# Altium schematic symbol library jlcpcb_2025_04_inductors_extended_0603.schlib: 1269 symbols (part 1 of 7) (continued)
## CMI160808U4R7MT
designator L?  Inductance: 4.7uH
Inductor, 4.7uH, ±20%, SMD 0603; Manufacturer: FH (Guangdong Fenghua Advanced Tech); Manufacturer Part Number: CMI160808U4R7MT; Package Size: 0603; JLCPCB Basic Part: No; JLCPCB Part Number: C3032678; Supplier 1: LCSC; Category: Inductors; Supplier Part Number 1: C3032678; Tolerance: ±20%; RoHS: Yes; ComponentLink1Description: Datasheet; ComponentLink1URL: https://wmsc.lcsc.com/wmsc/upload/file/pdf/v2/lcsc/2208051501_FH--Guangdong-Fenghua-Advanced-Tech-CMI160808U4R7MT_C3032678.pdf; ComponentLink2Description: JLCPCB Part URL; ComponentLink2URL: https://jlcpcb.com/partdetail/C3032678; ComponentLink3Description: LCSC Part URL; ComponentLink3URL: https://lcsc.com/product-detail/Inductors-SMD_FH-Guangdong-Fenghua-Advanced-Tech-FH-Guangdong-Fenghua-Advanced-Tech-CMI160808U4R7MT_C3032678.html
footprint IND-0603 (0603 (1608M) Inductor)
pins: 1, 2

## CMI160808V47NKT
designator L?  Inductance: 47nH
Inductor, 47nH, ±10%, SMD 0603; Manufacturer: FH (Guangdong Fenghua Advanced Tech); Manufacturer Part Number: CMI160808V47NKT; Package Size: 0603; JLCPCB Basic Part: No; JLCPCB Part Number: C3032610; Supplier 1: LCSC; Category: Inductors; Supplier Part Number 1: C3032610; Tolerance: ±10%; RoHS: Yes; ComponentLink1Description: Datasheet; ComponentLink1URL: https://wmsc.lcsc.com/wmsc/upload/file/pdf/v2/lcsc/2302231130_FH--Guangdong-Fenghua-Advanced-Tech-CMI160808V47NKT_C3032610.pdf; ComponentLink2Description: JLCPCB Part URL; ComponentLink2URL: https://jlcpcb.com/partdetail/C3032610; ComponentLink3Description: LCSC Part URL; ComponentLink3URL: https://lcsc.com/product-detail/Inductors-SMD_FH-Guangdong-Fenghua-Advanced-Tech-FH-Guangdong-Fenghua-Advanced-Tech-CMI160808V47NKT_C3032610.html
footprint IND-0603 (0603 (1608M) Inductor)
pins: 1, 2

## CMI160808V68NKT
designator L?  Inductance: 68nH
Inductor, 68nH, ±10%, SMD 0603; Manufacturer: FH (Guangdong Fenghua Advanced Tech); Manufacturer Part Number: CMI160808V68NKT; Package Size: 0603; JLCPCB Basic Part: No; JLCPCB Part Number: C3032609; Supplier 1: LCSC; Category: Inductors; Supplier Part Number 1: C3032609; Tolerance: ±10%; RoHS: Yes; ComponentLink1Description: Datasheet; ComponentLink1URL: https://wmsc.lcsc.com/wmsc/upload/file/pdf/v2/lcsc/2302231130_FH--Guangdong-Fenghua-Advanced-Tech-CMI160808V68NKT_C3032609.pdf; ComponentLink2Description: JLCPCB Part URL; ComponentLink2URL: https://jlcpcb.com/partdetail/C3032609; ComponentLink3Description: LCSC Part URL; ComponentLink3URL: https://lcsc.com/product-detail/Inductors-SMD_FH-Guangdong-Fenghua-Advanced-Tech-FH-Guangdong-Fenghua-Advanced-Tech-CMI160808V68NKT_C3032609.html
footprint IND-0603 (0603 (1608M) Inductor)
pins: 1, 2

## CMI160808V82NKT
designator L?  Inductance: 82nH
Inductor, 82nH, ±10%, SMD 0603; Manufacturer: FH (Guangdong Fenghua Advanced Tech); Manufacturer Part Number: CMI160808V82NKT; Package Size: 0603; JLCPCB Basic Part: No; JLCPCB Part Number: C3032612; Supplier 1: LCSC; Category: Inductors; Supplier Part Number 1: C3032612; Tolerance: ±10%; RoHS: Yes; ComponentLink1Description: Datasheet; ComponentLink1URL: https://wmsc.lcsc.com/wmsc/upload/file/pdf/v2/lcsc/2302231130_FH--Guangdong-Fenghua-Advanced-Tech-CMI160808V82NKT_C3032612.pdf; ComponentLink2Description: JLCPCB Part URL; ComponentLink2URL: https://jlcpcb.com/partdetail/C3032612; ComponentLink3Description: LCSC Part URL; ComponentLink3URL: https://lcsc.com/product-detail/Inductors-SMD_FH-Guangdong-Fenghua-Advanced-Tech-FH-Guangdong-Fenghua-Advanced-Tech-CMI160808V82NKT_C3032612.html
footprint IND-0603 (0603 (1608M) Inductor)
pins: 1, 2

## CMI160808VR10KT
designator L?  Inductance: 100nH
Inductor, 100nH, ±10%, 250mΩ, 50mA, SMD 0603; Manufacturer: FH(Guangdong Fenghua Advanced Tech); Manufacturer Part Number: CMI160808VR10KT; Package Size: 0603; JLCPCB Basic Part: No; JLCPCB Part Number: C394965; Supplier 1: LCSC; Category: Inductors; Supplier Part Number 1: C394965; Tolerance: ±10%; Rated Current: 50mA; DC Resistance: 250mΩ; RoHS: Yes; ComponentLink1Description: Datasheet; ComponentLink1URL: https://wmsc.lcsc.com/wmsc/upload/file/pdf/v2/lcsc/2302231208_FH--Guangdong-Fenghua-Advanced-Tech-CMI160808VR10KT_C394965.pdf; ComponentLink2Description: JLCPCB Part URL; ComponentLink2URL: https://jlcpcb.com/partdetail/C394965; ComponentLink3Description: LCSC Part URL; ComponentLink3URL: https://lcsc.com/product-detail/Inductors-SMD_FH-Guangdong-Fenghua-Advanced-Tech-FH-Guangdong-Fenghua-Advanced-Tech-CMI160808VR10KT_C394965.html
footprint IND-0603 (0603 (1608M) Inductor)
pins: 1, 2

## CMI160808VR12KT
designator L?  Inductance: 120nH
Inductor, 120nH, ±10%, 300mΩ, 50mA, SMD 0603; Manufacturer: FH(Guangdong Fenghua Advanced Tech); Manufacturer Part Number: CMI160808VR12KT; Package Size: 0603; JLCPCB Basic Part: No; JLCPCB Part Number: C394966; Supplier 1: LCSC; Category: Inductors; Supplier Part Number 1: C394966; Tolerance: ±10%; Rated Current: 50mA; DC Resistance: 300mΩ; RoHS: Yes; ComponentLink1Description: Datasheet; ComponentLink1URL: https://wmsc.lcsc.com/wmsc/upload/file/pdf/v2/lcsc/2302231208_FH--Guangdong-Fenghua-Advanced-Tech-CMI160808VR12KT_C394966.pdf; ComponentLink2Description: JLCPCB Part URL; ComponentLink2URL: https://jlcpcb.com/partdetail/C394966; ComponentLink3Description: LCSC Part URL; ComponentLink3URL: https://lcsc.com/product-detail/Inductors-SMD_FH-Guangdong-Fenghua-Advanced-Tech-FH-Guangdong-Fenghua-Advanced-Tech-CMI160808VR12KT_C394966.html
footprint IND-0603 (0603 (1608M) Inductor)
pins: 1, 2

## CMI160808VR15KT
designator L?  Inductance: 150nH
Inductor, 150nH, ±10%, 300mΩ, 50mA, SMD 0603; Manufacturer: FH(Guangdong Fenghua Advanced Tech); Manufacturer Part Number: CMI160808VR15KT; Package Size: 0603; JLCPCB Basic Part: No; JLCPCB Part Number: C394967; Supplier 1: LCSC; Category: Inductors; Supplier Part Number 1: C394967; Tolerance: ±10%; Rated Current: 50mA; DC Resistance: 300mΩ; RoHS: Yes; ComponentLink1Description: Datasheet; ComponentLink1URL: https://wmsc.lcsc.com/wmsc/upload/file/pdf/v2/lcsc/2302231208_FH--Guangdong-Fenghua-Advanced-Tech-CMI160808VR15KT_C394967.pdf; ComponentLink2Description: JLCPCB Part URL; ComponentLink2URL: https://jlcpcb.com/partdetail/C394967; ComponentLink3Description: LCSC Part URL; ComponentLink3URL: https://lcsc.com/product-detail/Inductors-SMD_FH-Guangdong-Fenghua-Advanced-Tech-FH-Guangdong-Fenghua-Advanced-Tech-CMI160808VR15KT_C394967.html
footprint IND-0603 (0603 (1608M) Inductor)
pins: 1, 2

## CMI160808VR18KT
designator L?  Inductance: 180nH
Inductor, 180nH, ±10%, 300mΩ, 50mA, SMD 0603; Manufacturer: FH(Guangdong Fenghua Advanced Tech); Manufacturer Part Number: CMI160808VR18KT; Package Size: 0603; JLCPCB Basic Part: No; JLCPCB Part Number: C361670; Supplier 1: LCSC; Category: Inductors; Supplier Part Number 1: C361670; Tolerance: ±10%; Rated Current: 50mA; DC Resistance: 300mΩ; RoHS: Yes; ComponentLink1Description: Datasheet; ComponentLink1URL: https://wmsc.lcsc.com/wmsc/upload/file/pdf/v2/lcsc/2302231208_FH--Guangdong-Fenghua-Advanced-Tech-CMI160808VR18KT_C361670.pdf; ComponentLink2Description: JLCPCB Part URL; ComponentLink2URL: https://jlcpcb.com/partdetail/C361670; ComponentLink3Description: LCSC Part URL; ComponentLink3URL: https://lcsc.com/product-detail/Inductors-SMD_FH-Guangdong-Fenghua-Advanced-Tech-FH-Guangdong-Fenghua-Advanced-Tech-CMI160808VR18KT_C361670.html
footprint IND-0603 (0603 (1608M) Inductor)
pins: 1, 2

## CMI160808VR22KT
designator L?  Inductance: 220nH
Inductor, 220nH, ±10%, 400mΩ, 50mA, SMD 0603; Manufacturer: FH(Guangdong Fenghua Advanced Tech); Manufacturer Part Number: CMI160808VR22KT; Package Size: 0603; JLCPCB Basic Part: No; JLCPCB Part Number: C139211; Supplier 1: LCSC; Category: Inductors; Supplier Part Number 1: C139211; Tolerance: ±10%; Rated Current: 50mA; DC Resistance: 400mΩ; RoHS: Yes; ComponentLink1Description: Datasheet; ComponentLink1URL: https://wmsc.lcsc.com/wmsc/upload/file/pdf/v2/lcsc/2302231230_FH--Guangdong-Fenghua-Advanced-Tech-CMI160808VR22KT_C139211.pdf; ComponentLink2Description: JLCPCB Part URL; ComponentLink2URL: https://jlcpcb.com/partdetail/C139211; ComponentLink3Description: LCSC Part URL; ComponentLink3URL: https://lcsc.com/product-detail/Inductors-SMD_FH-Guangdong-Fenghua-Advanced-Tech-FH-Guangdong-Fenghua-Advanced-Tech-CMI160808VR22KT_C139211.html
footprint IND-0603 (0603 (1608M) Inductor)
pins: 1, 2

## CMI160808VR27KT
designator L?  Inductance: 270nH
Inductor, 270nH, ±10%, 450mΩ, 50mA, SMD 0603; Manufacturer: FH(Guangdong Fenghua Advanced Tech); Manufacturer Part Number: CMI160808VR27KT; Package Size: 0603; JLCPCB Basic Part: No; JLCPCB Part Number: C139212; Supplier 1: LCSC; Category: Inductors; Supplier Part Number 1: C139212; Tolerance: ±10%; Rated Current: 50mA; DC Resistance: 450mΩ; RoHS: Yes; ComponentLink1Description: Datasheet; ComponentLink1URL: https://wmsc.lcsc.com/wmsc/upload/file/pdf/v2/lcsc/2302231230_FH--Guangdong-Fenghua-Advanced-Tech-CMI160808VR27KT_C139212.pdf; ComponentLink2Description: JLCPCB Part URL; ComponentLink2URL: https://jlcpcb.com/partdetail/C139212; ComponentLink3Description: LCSC Part URL; ComponentLink3URL: https://lcsc.com/product-detail/Inductors-SMD_FH-Guangdong-Fenghua-Advanced-Tech-FH-Guangdong-Fenghua-Advanced-Tech-CMI160808VR27KT_C139212.html
footprint IND-0603 (0603 (1608M) Inductor)
pins: 1, 2

## CMI160808VR33KT
designator L?  Inductance: 330nH
Inductor, 330nH, ±10%, 500mΩ, 50mA, SMD 0603; Manufacturer: FH(Guangdong Fenghua Advanced Tech); Manufacturer Part Number: CMI160808VR33KT; Package Size: 0603; JLCPCB Basic Part: No; JLCPCB Part Number: C394968; Supplier 1: LCSC; Category: Inductors; Supplier Part Number 1: C394968; Tolerance: ±10%; Rated Current: 50mA; DC Resistance: 500mΩ; RoHS: Yes; ComponentLink1Description: Datasheet; ComponentLink1URL: https://wmsc.lcsc.com/wmsc/upload/file/pdf/v2/lcsc/2302231208_FH--Guangdong-Fenghua-Advanced-Tech-CMI160808VR33KT_C394968.pdf; ComponentLink2Description: JLCPCB Part URL; ComponentLink2URL: https://jlcpcb.com/partdetail/C394968; ComponentLink3Description: LCSC Part URL; ComponentLink3URL: https://lcsc.com/product-detail/Inductors-SMD_FH-Guangdong-Fenghua-Advanced-Tech-FH-Guangdong-Fenghua-Advanced-Tech-CMI160808VR33KT_C394968.html
footprint IND-0603 (0603 (1608M) Inductor)
pins: 1, 2

## CMI160808VR39KT
designator L?  Inductance: 390nH
Inductor, 390nH, ±10%, 600mΩ, 50mA, SMD 0603; Manufacturer: FH(Guangdong Fenghua Advanced Tech); Manufacturer Part Number: CMI160808VR39KT; Package Size: 0603; JLCPCB Basic Part: No; JLCPCB Part Number: C139213; Supplier 1: LCSC; Category: Inductors; Supplier Part Number 1: C139213; Tolerance: ±10%; Rated Current: 50mA; DC Resistance: 600mΩ; RoHS: Yes; ComponentLink1Description: Datasheet; ComponentLink1URL: https://wmsc.lcsc.com/wmsc/upload/file/pdf/v2/lcsc/2302231230_FH--Guangdong-Fenghua-Advanced-Tech-CMI160808VR39KT_C139213.pdf; ComponentLink2Description: JLCPCB Part URL; ComponentLink2URL: https://jlcpcb.com/partdetail/C139213; ComponentLink3Description: LCSC Part URL; ComponentLink3URL: https://lcsc.com/product-detail/Inductors-SMD_FH-Guangdong-Fenghua-Advanced-Tech-FH-Guangdong-Fenghua-Advanced-Tech-CMI160808VR39KT_C139213.html
footprint IND-0603 (0603 (1608M) Inductor)
pins: 1, 2

## CMI160808VR47KT
designator L?  Inductance: 470nH
Inductor, 470nH, ±10%, 700mΩ, 50mA, SMD 0603; Manufacturer: FH(Guangdong Fenghua Advanced Tech); Manufacturer Part Number: CMI160808VR47KT; Package Size: 0603; JLCPCB Basic Part: No; JLCPCB Part Number: C139214; Supplier 1: LCSC; Category: Inductors; Supplier Part Number 1: C139214; Tolerance: ±10%; Rated Current: 50mA; DC Resistance: 700mΩ; RoHS: Yes; ComponentLink1Description: Datasheet; ComponentLink1URL: https://wmsc.lcsc.com/wmsc/upload/file/pdf/v2/lcsc/2302231230_FH--Guangdong-Fenghua-Advanced-Tech-CMI160808VR47KT_C139214.pdf; ComponentLink2Description: JLCPCB Part URL; ComponentLink2URL: https://jlcpcb.com/partdetail/C139214; ComponentLink3Description: LCSC Part URL; ComponentLink3URL: https://lcsc.com/product-detail/Inductors-SMD_FH-Guangdong-Fenghua-Advanced-Tech-FH-Guangdong-Fenghua-Advanced-Tech-CMI160808VR47KT_C139214.html
footprint IND-0603 (0603 (1608M) Inductor)
pins: 1, 2

## CMI160808VR56KT
designator L?  Inductance: 560nH
Inductor, 560nH, ±10%, 700mΩ, 50mA, SMD 0603; Manufacturer: FH(Guangdong Fenghua Advanced Tech); Manufacturer Part Number: CMI160808VR56KT; Package Size: 0603; JLCPCB Basic Part: No; JLCPCB Part Number: C139215; Supplier 1: LCSC; Category: Inductors; Supplier Part Number 1: C139215; Tolerance: ±10%; Rated Current: 50mA; DC Resistance: 700mΩ; RoHS: Yes; ComponentLink1Description: Datasheet; ComponentLink1URL: https://wmsc.lcsc.com/wmsc/upload/file/pdf/v2/lcsc/2302231230_FH--Guangdong-Fenghua-Advanced-Tech-CMI160808VR56KT_C139215.pdf; ComponentLink2Description: JLCPCB Part URL; ComponentLink2URL: https://jlcpcb.com/partdetail/C139215; ComponentLink3Description: LCSC Part URL; ComponentLink3URL: https://lcsc.com/product-detail/Inductors-SMD_FH-Guangdong-Fenghua-Advanced-Tech-FH-Guangdong-Fenghua-Advanced-Tech-CMI160808VR56KT_C139215.html
footprint IND-0603 (0603 (1608M) Inductor)
pins: 1, 2

## CMI160808VR68KT
designator L?  Inductance: 680nH
Inductor, 680nH, ±10%, 900mΩ, 50mA, SMD 0603; Manufacturer: FH(Guangdong Fenghua Advanced Tech); Manufacturer Part Number: CMI160808VR68KT; Package Size: 0603; JLCPCB Basic Part: No; JLCPCB Part Number: C139216; Supplier 1: LCSC; Category: Inductors; Supplier Part Number 1: C139216; Tolerance: ±10%; Rated Current: 50mA; DC Resistance: 900mΩ; RoHS: Yes; ComponentLink1Description: Datasheet; ComponentLink1URL: https://wmsc.lcsc.com/wmsc/upload/file/pdf/v2/lcsc/2302231230_FH--Guangdong-Fenghua-Advanced-Tech-CMI160808VR68KT_C139216.pdf; ComponentLink2Description: JLCPCB Part URL; ComponentLink2URL: https://jlcpcb.com/partdetail/C139216; ComponentLink3Description: LCSC Part URL; ComponentLink3URL: https://lcsc.com/product-detail/Inductors-SMD_FH-Guangdong-Fenghua-Advanced-Tech-FH-Guangdong-Fenghua-Advanced-Tech-CMI160808VR68KT_C139216.html
footprint IND-0603 (0603 (1608M) Inductor)
pins: 1, 2

## CMI160808VR82KT
designator L?  Inductance: 820nH
Inductor, 820nH, ±10%, 1Ω, 50mA, SMD 0603; Manufacturer: FH(Guangdong Fenghua Advanced Tech); Manufacturer Part Number: CMI160808VR82KT; Package Size: 0603; JLCPCB Basic Part: No; JLCPCB Part Number: C139217; Supplier 1: LCSC; Category: Inductors; Supplier Part Number 1: C139217; Tolerance: ±10%; Rated Current: 50mA; DC Resistance: 1Ω; RoHS: Yes; ComponentLink1Description: Datasheet; ComponentLink1URL: https://wmsc.lcsc.com/wmsc/upload/file/pdf/v2/lcsc/2302231230_FH--Guangdong-Fenghua-Advanced-Tech-CMI160808VR82KT_C139217.pdf; ComponentLink2Description: JLCPCB Part URL; ComponentLink2URL: https://jlcpcb.com/partdetail/C139217; ComponentLink3Description: LCSC Part URL; ComponentLink3URL: https://lcsc.com/product-detail/Inductors-SMD_FH-Guangdong-Fenghua-Advanced-Tech-FH-Guangdong-Fenghua-Advanced-Tech-CMI160808VR82KT_C139217.html
footprint IND-0603 (0603 (1608M) Inductor)
pins: 1, 2

## CMP160808JE5R6MT
designator L?  Inductance: 5.6uH
Inductor, 5.6uH, ±20%, 900mΩ, 60mA, SMD 0603; Manufacturer: FH(Guangdong Fenghua Advanced Tech); Manufacturer Part Number: CMP160808JE5R6MT; Self-Resonant Frequency: 22MHz; Package Size: 0603; JLCPCB Basic Part: No; JLCPCB Part Number: C395002; Supplier 1: LCSC; Category: Inductors; Supplier Part Number 1: C395002; Tolerance: ±20%; Rated Current: 60mA; DC Resistance: 900mΩ; RoHS: Yes; ComponentLink1Description: Datasheet; ComponentLink1URL: https://wmsc.lcsc.com/wmsc/upload/file/pdf/v2/lcsc/2302231030_FH--Guangdong-Fenghua-Advanced-Tech-CMP160808JE5R6MT_C395002.pdf; ComponentLink2Description: JLCPCB Part URL; ComponentLink2URL: https://jlcpcb.com/partdetail/C395002; ComponentLink3Description: LCSC Part URL; ComponentLink3URL: https://lcsc.com/product-detail/Inductors-SMD_FH-Guangdong-Fenghua-Advanced-Tech-FH-Guangdong-Fenghua-Advanced-Tech-CMP160808JE5R6MT_C395002.html
footprint IND-0603 (0603 (1608M) Inductor)
pins: 1, 2

## CMP160808JE6R8MT
designator L?  Inductance: 6.8uH
Inductor, 6.8uH, ±20%, 900mΩ, 60mA, SMD 0603; Manufacturer: FH(Guangdong Fenghua Advanced Tech); Manufacturer Part Number: CMP160808JE6R8MT; Self-Resonant Frequency: 20MHz; Package Size: 0603; JLCPCB Basic Part: No; JLCPCB Part Number: C395003; Supplier 1: LCSC; Category: Inductors; Supplier Part Number 1: C395003; Tolerance: ±20%; Rated Current: 60mA; DC Resistance: 900mΩ; RoHS: Yes; ComponentLink1Description: Datasheet; ComponentLink1URL: https://wmsc.lcsc.com/wmsc/upload/file/pdf/v2/lcsc/2302231030_FH--Guangdong-Fenghua-Advanced-Tech-CMP160808JE6R8MT_C395003.pdf; ComponentLink2Description: JLCPCB Part URL; ComponentLink2URL: https://jlcpcb.com/partdetail/C395003; ComponentLink3Description: LCSC Part URL; ComponentLink3URL: https://lcsc.com/product-detail/Inductors-SMD_FH-Guangdong-Fenghua-Advanced-Tech-FH-Guangdong-Fenghua-Advanced-Tech-CMP160808JE6R8MT_C395003.html
footprint IND-0603 (0603 (1608M) Inductor)
pins: 1, 2

## CMP160808JE8R2MT
designator L?  Inductance: 8.2uH
Inductor, 8.2uH, ±20%, 1.05Ω, 60mA, SMD 0603; Manufacturer: FH(Guangdong Fenghua Advanced Tech); Manufacturer Part Number: CMP160808JE8R2MT; Self-Resonant Frequency: 18MHz; Package Size: 0603; JLCPCB Basic Part: No; JLCPCB Part Number: C395004; Supplier 1: LCSC; Category: Inductors; Supplier Part Number 1: C395004; Tolerance: ±20%; Rated Current: 60mA; DC Resistance: 1.05Ω; RoHS: Yes; ComponentLink1Description: Datasheet; ComponentLink1URL: https://wmsc.lcsc.com/wmsc/upload/file/pdf/v2/lcsc/2302231030_FH--Guangdong-Fenghua-Advanced-Tech-CMP160808JE8R2MT_C395004.pdf; ComponentLink2Description: JLCPCB Part URL; ComponentLink2URL: https://jlcpcb.com/partdetail/C395004; ComponentLink3Description: LCSC Part URL; ComponentLink3URL: https://lcsc.com/product-detail/Inductors-SMD_FH-Guangdong-Fenghua-Advanced-Tech-FH-Guangdong-Fenghua-Advanced-Tech-CMP160808JE8R2MT_C395004.html
footprint IND-0603 (0603 (1608M) Inductor)
pins: 1, 2

## CMP160808JE100MT
designator L?  Inductance: 10uH
Inductor, 10uH, ±20%, 1.15Ω, 60mA, SMD 0603; Manufacturer: FH(Guangdong Fenghua Advanced Tech); Manufacturer Part Number: CMP160808JE100MT; Self-Resonant Frequency: 17MHz; Package Size: 0603; JLCPCB Basic Part: No; JLCPCB Part Number: C395000; Supplier 1: LCSC; Category: Inductors; Supplier Part Number 1: C395000; Tolerance: ±20%; Rated Current: 60mA; DC Resistance: 1.15Ω; RoHS: Yes; ComponentLink1Description: Datasheet; ComponentLink1URL: https://wmsc.lcsc.com/wmsc/upload/file/pdf/v2/lcsc/2302231030_FH--Guangdong-Fenghua-Advanced-Tech-CMP160808JE100MT_C395000.pdf; ComponentLink2Description: JLCPCB Part URL; ComponentLink2URL: https://jlcpcb.com/partdetail/C395000; ComponentLink3Description: LCSC Part URL; ComponentLink3URL: https://lcsc.com/product-detail/Inductors-SMD_FH-Guangdong-Fenghua-Advanced-Tech-FH-Guangdong-Fenghua-Advanced-Tech-CMP160808JE100MT_C395000.html
footprint IND-0603 (0603 (1608M) Inductor)
pins: 1, 2

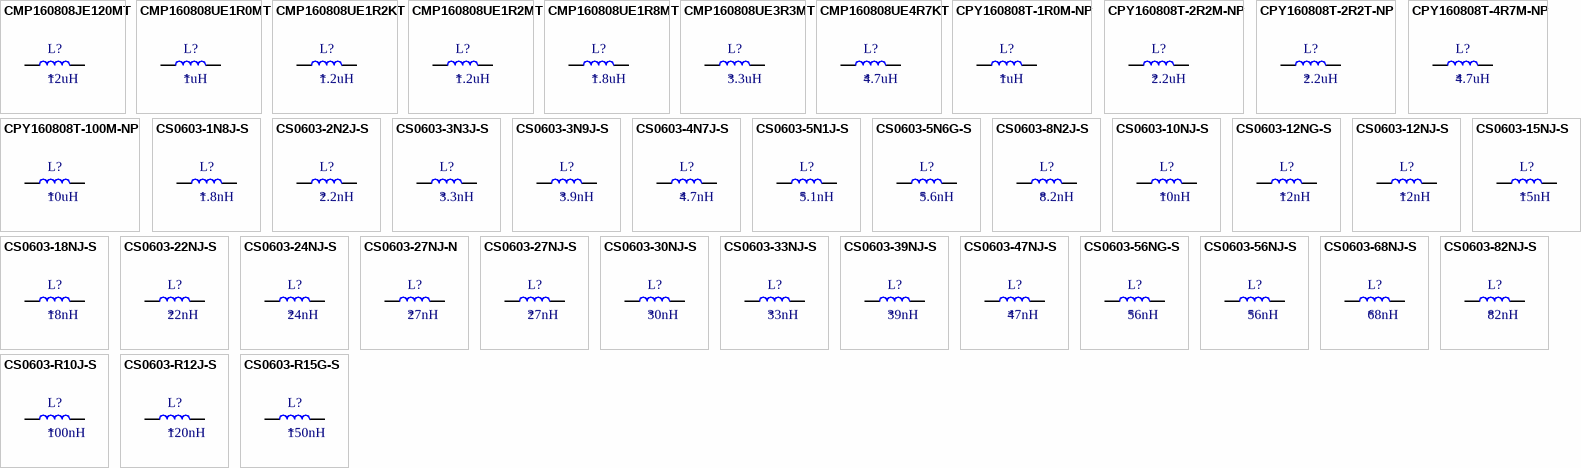
[diagram p4: symbols CMP160808JE120MT to CS0603-R15G-S]

## CMP160808JE120MT
designator L?  Inductance: 12uH
Inductor, 12uH, ±20%, 1.25Ω, 60mA, SMD 0603; Manufacturer: FH(Guangdong Fenghua Advanced Tech); Manufacturer Part Number: CMP160808JE120MT; Self-Resonant Frequency: 15MHz; Package Size: 0603; JLCPCB Basic Part: No; JLCPCB Part Number: C395001; Supplier 1: LCSC; Category: Inductors; Supplier Part Number 1: C395001; Tolerance: ±20%; Rated Current: 60mA; DC Resistance: 1.25Ω; RoHS: Yes; ComponentLink1Description: Datasheet; ComponentLink1URL: https://wmsc.lcsc.com/wmsc/upload/file/pdf/v2/lcsc/2302231030_FH--Guangdong-Fenghua-Advanced-Tech-CMP160808JE120MT_C395001.pdf; ComponentLink2Description: JLCPCB Part URL; ComponentLink2URL: https://jlcpcb.com/partdetail/C395001; ComponentLink3Description: LCSC Part URL; ComponentLink3URL: https://lcsc.com/product-detail/Inductors-SMD_FH-Guangdong-Fenghua-Advanced-Tech-FH-Guangdong-Fenghua-Advanced-Tech-CMP160808JE120MT_C395001.html
footprint IND-0603 (0603 (1608M) Inductor)
pins: 1, 2

## CMP160808UE1R0MT
designator L?  Inductance: 1uH
Inductor, 1uH, ±20%, 300mΩ, 150mA, SMD 0603; Manufacturer: FH(Guangdong Fenghua Advanced Tech); Manufacturer Part Number: CMP160808UE1R0MT; Self-Resonant Frequency: 75MHz; Package Size: 0603; JLCPCB Basic Part: No; JLCPCB Part Number: C395005; Supplier 1: LCSC; Category: Inductors; Supplier Part Number 1: C395005; Tolerance: ±20%; Rated Current: 150mA; DC Resistance: 300mΩ; RoHS: Yes; ComponentLink1Description: Datasheet; ComponentLink1URL: https://wmsc.lcsc.com/wmsc/upload/file/pdf/v2/lcsc/2302231030_FH--Guangdong-Fenghua-Advanced-Tech-CMP160808UE1R0MT_C395005.pdf; ComponentLink2Description: JLCPCB Part URL; ComponentLink2URL: https://jlcpcb.com/partdetail/C395005; ComponentLink3Description: LCSC Part URL; ComponentLink3URL: https://lcsc.com/product-detail/Inductors-SMD_FH-Guangdong-Fenghua-Advanced-Tech-FH-Guangdong-Fenghua-Advanced-Tech-CMP160808UE1R0MT_C395005.html
footprint IND-0603 (0603 (1608M) Inductor)
pins: 1, 2

## CMP160808UE1R2KT
designator L?  Inductance: 1.2uH
Inductor, 1.2uH, ±10%, SMD 0603; Manufacturer: FH(Guangdong Fenghua Advanced Tech); Manufacturer Part Number: CMP160808UE1R2KT; Package Size: 0603; JLCPCB Basic Part: No; JLCPCB Part Number: C401478; Supplier 1: LCSC; Category: Inductors; Supplier Part Number 1: C401478; Tolerance: ±10%; RoHS: Yes; ComponentLink1Description: Datasheet; ComponentLink1URL: https://wmsc.lcsc.com/wmsc/upload/file/pdf/v2/lcsc/1912111437_FH--Guangdong-Fenghua-Advanced-Tech-CMP160808UE1R2KT_C401478.pdf; ComponentLink2Description: JLCPCB Part URL; ComponentLink2URL: https://jlcpcb.com/partdetail/C401478; ComponentLink3Description: LCSC Part URL; ComponentLink3URL: https://lcsc.com/product-detail/Inductors-SMD_FH-Guangdong-Fenghua-Advanced-Tech-FH-Guangdong-Fenghua-Advanced-Tech-CMP160808UE1R2KT_C401478.html
footprint IND-0603 (0603 (1608M) Inductor)
pins: 1, 2

## CMP160808UE1R2MT
designator L?  Inductance: 1.2uH
Inductor, 1.2uH, ±20%, 300mΩ, 150mA, SMD 0603; Manufacturer: FH(Guangdong Fenghua Advanced Tech); Manufacturer Part Number: CMP160808UE1R2MT; Self-Resonant Frequency: 65MHz; Package Size: 0603; JLCPCB Basic Part: No; JLCPCB Part Number: C395006; Supplier 1: LCSC; Category: Inductors; Supplier Part Number 1: C395006; Tolerance: ±20%; Rated Current: 150mA; DC Resistance: 300mΩ; RoHS: Yes; ComponentLink1Description: Datasheet; ComponentLink1URL: https://wmsc.lcsc.com/wmsc/upload/file/pdf/v2/lcsc/2302231030_FH--Guangdong-Fenghua-Advanced-Tech-CMP160808UE1R2MT_C395006.pdf; ComponentLink2Description: JLCPCB Part URL; ComponentLink2URL: https://jlcpcb.com/partdetail/C395006; ComponentLink3Description: LCSC Part URL; ComponentLink3URL: https://lcsc.com/product-detail/Inductors-SMD_FH-Guangdong-Fenghua-Advanced-Tech-FH-Guangdong-Fenghua-Advanced-Tech-CMP160808UE1R2MT_C395006.html
footprint IND-0603 (0603 (1608M) Inductor)
pins: 1, 2

## CMP160808UE1R8MT
designator L?  Inductance: 1.8uH
Inductor, 1.8uH, ±20%, 400mΩ, 120mA, SMD 0603; Manufacturer: FH(Guangdong Fenghua Advanced Tech); Manufacturer Part Number: CMP160808UE1R8MT; Self-Resonant Frequency: 55MHz; Package Size: 0603; JLCPCB Basic Part: No; JLCPCB Part Number: C395007; Supplier 1: LCSC; Category: Inductors; Supplier Part Number 1: C395007; Tolerance: ±20%; Rated Current: 120mA; DC Resistance: 400mΩ; RoHS: Yes; ComponentLink1Description: Datasheet; ComponentLink1URL: https://wmsc.lcsc.com/wmsc/upload/file/pdf/v2/lcsc/2302231030_FH--Guangdong-Fenghua-Advanced-Tech-CMP160808UE1R8MT_C395007.pdf; ComponentLink2Description: JLCPCB Part URL; ComponentLink2URL: https://jlcpcb.com/partdetail/C395007; ComponentLink3Description: LCSC Part URL; ComponentLink3URL: https://lcsc.com/product-detail/Inductors-SMD_FH-Guangdong-Fenghua-Advanced-Tech-FH-Guangdong-Fenghua-Advanced-Tech-CMP160808UE1R8MT_C395007.html
footprint IND-0603 (0603 (1608M) Inductor)
pins: 1, 2

## CMP160808UE3R3MT
designator L?  Inductance: 3.3uH
Inductor, 3.3uH, ±20%, SMD 0603; Manufacturer: FH(Guangdong Fenghua Advanced Tech); Manufacturer Part Number: CMP160808UE3R3MT; Package Size: 0603; JLCPCB Basic Part: No; JLCPCB Part Number: C395008; Supplier 1: LCSC; Category: Inductors; Supplier Part Number 1: C395008; Tolerance: ±20%; RoHS: Yes; ComponentLink1Description: Datasheet; ComponentLink1URL: https://wmsc.lcsc.com/wmsc/upload/file/pdf/v2/lcsc/2302231030_FH--Guangdong-Fenghua-Advanced-Tech-CMP160808UE3R3MT_C395008.pdf; ComponentLink2Description: JLCPCB Part URL; ComponentLink2URL: https://jlcpcb.com/partdetail/C395008; ComponentLink3Description: LCSC Part URL; ComponentLink3URL: https://lcsc.com/product-detail/Inductors-SMD_FH-Guangdong-Fenghua-Advanced-Tech-FH-Guangdong-Fenghua-Advanced-Tech-CMP160808UE3R3MT_C395008.html
footprint IND-0603 (0603 (1608M) Inductor)
pins: 1, 2

## CMP160808UE4R7KT
designator L?  Inductance: 4.7uH
Inductor, 4.7uH, ±10%, SMD 0603; Manufacturer: FH (Guangdong Fenghua Advanced Tech); Manufacturer Part Number: CMP160808UE4R7KT; Package Size: 0603; JLCPCB Basic Part: No; JLCPCB Part Number: C778447; Supplier 1: LCSC; Category: Inductors; Supplier Part Number 1: C778447; Tolerance: ±10%; RoHS: Yes; ComponentLink1Description: Datasheet; ComponentLink2Description: JLCPCB Part URL; ComponentLink2URL: https://jlcpcb.com/partdetail/C778447; ComponentLink3Description: LCSC Part URL; ComponentLink3URL: https://lcsc.com/product-detail/Inductors-SMD_FH-Guangdong-Fenghua-Advanced-Tech-FH-Guangdong-Fenghua-Advanced-Tech-CMP160808UE4R7KT_C778447.html
footprint IND-0603 (0603 (1608M) Inductor)
pins: 1, 2

## CPY160808T-1R0M-NP
designator L?  Inductance: 1uH
Inductor, 1uH, ±20%, 120mΩ, 1.5A, SMD 0603; Manufacturer: Chilisin Elec; Manufacturer Part Number: CPY160808T-1R0M-NP; Package Size: 0603; JLCPCB Basic Part: No; JLCPCB Part Number: C285967; Supplier 1: LCSC; Category: Inductors; Supplier Part Number 1: C285967; Tolerance: ±20%; Rated Current: 1.5A; DC Resistance: 120mΩ; RoHS: Yes; ComponentLink1Description: Datasheet; ComponentLink1URL: https://wmsc.lcsc.com/wmsc/upload/file/pdf/v2/lcsc/2108251130_Chilisin-Elec-CPY160808T-1R0M-NP_C285967.pdf; ComponentLink2Description: JLCPCB Part URL; ComponentLink2URL: https://jlcpcb.com/partdetail/C285967; ComponentLink3Description: LCSC Part URL; ComponentLink3URL: https://lcsc.com/product-detail/Inductors-SMD_Chilisin-Elec-Chilisin-Elec-CPY160808T-1R0M-NP_C285967.html
footprint IND-0603 (0603 (1608M) Inductor)
pins: 1, 2

## CPY160808T-2R2M-NP
designator L?  Inductance: 2.2uH
Inductor, 2.2uH, ±20%, 200mΩ, 1A, SMD 0603; Manufacturer: Chilisin Elec; Manufacturer Part Number: CPY160808T-2R2M-NP; Package Size: 0603; JLCPCB Basic Part: No; JLCPCB Part Number: C365953; Supplier 1: LCSC; Category: Inductors; Supplier Part Number 1: C365953; Tolerance: ±20%; Rated Current: 1A; DC Resistance: 200mΩ; RoHS: Yes; ComponentLink1Description: Datasheet; ComponentLink1URL: https://wmsc.lcsc.com/wmsc/upload/file/pdf/v2/lcsc/1912111437_Chilisin-Elec-CPY160808T-2R2M-NP_C365953.pdf; ComponentLink2Description: JLCPCB Part URL; ComponentLink2URL: https://jlcpcb.com/partdetail/C365953; ComponentLink3Description: LCSC Part URL; ComponentLink3URL: https://lcsc.com/product-detail/Inductors-SMD_Chilisin-Elec-Chilisin-Elec-CPY160808T-2R2M-NP_C365953.html
footprint IND-0603 (0603 (1608M) Inductor)
pins: 1, 2

## CPY160808T-2R2T-NP
designator L?  Inductance: 2.2uH
Inductor, 2.2uH, ±30%, 200mΩ, 1A, SMD 0603; Manufacturer: Chilisin Elec; Manufacturer Part Number: CPY160808T-2R2T-NP; Package Size: 0603; JLCPCB Basic Part: No; JLCPCB Part Number: C285966; Supplier 1: LCSC; Category: Inductors; Supplier Part Number 1: C285966; Tolerance: ±30%; Rated Current: 1A; DC Resistance: 200mΩ; RoHS: Yes; ComponentLink1Description: Datasheet; ComponentLink1URL: https://wmsc.lcsc.com/wmsc/upload/file/pdf/v2/lcsc/2304140030_Chilisin-Elec-CPY160808T-2R2T-NP_C285966.pdf; ComponentLink2Description: JLCPCB Part URL; ComponentLink2URL: https://jlcpcb.com/partdetail/C285966; ComponentLink3Description: LCSC Part URL; ComponentLink3URL: https://lcsc.com/product-detail/Inductors-SMD_Chilisin-Elec-Chilisin-Elec-CPY160808T-2R2T-NP_C285966.html
footprint IND-0603 (0603 (1608M) Inductor)
pins: 1, 2

## CPY160808T-4R7M-NP
designator L?  Inductance: 4.7uH
Inductor, 4.7uH, ±20%, 250mΩ, 800mA, SMD 0603; Manufacturer: Chilisin Elec; Manufacturer Part Number: CPY160808T-4R7M-NP; Package Size: 0603; JLCPCB Basic Part: No; JLCPCB Part Number: C295681; Supplier 1: LCSC; Category: Inductors; Supplier Part Number 1: C295681; Tolerance: ±20%; Rated Current: 800mA; DC Resistance: 250mΩ; RoHS: Yes; ComponentLink1Description: Datasheet; ComponentLink1URL: https://wmsc.lcsc.com/wmsc/upload/file/pdf/v2/lcsc/2304140030_Chilisin-Elec-CPY160808T-4R7M-NP_C295681.pdf; ComponentLink2Description: JLCPCB Part URL; ComponentLink2URL: https://jlcpcb.com/partdetail/C295681; ComponentLink3Description: LCSC Part URL; ComponentLink3URL: https://lcsc.com/product-detail/Inductors-SMD_Chilisin-Elec-Chilisin-Elec-CPY160808T-4R7M-NP_C295681.html
footprint IND-0603 (0603 (1608M) Inductor)
pins: 1, 2

## CPY160808T-100M-NP
designator L?  Inductance: 10uH
Inductor, 10uH, ±20%, 900mΩ, 90mA, SMD 0603; Manufacturer: Chilisin Elec; Manufacturer Part Number: CPY160808T-100M-NP; Package Size: 0603; JLCPCB Basic Part: No; JLCPCB Part Number: C285968; Supplier 1: LCSC; Category: Inductors; Supplier Part Number 1: C285968; Tolerance: ±20%; Rated Current: 90mA; DC Resistance: 900mΩ; RoHS: Yes; ComponentLink1Description: Datasheet; ComponentLink1URL: https://wmsc.lcsc.com/wmsc/upload/file/pdf/v2/lcsc/2304140030_Chilisin-Elec-CPY160808T-100M-NP_C285968.pdf; ComponentLink2Description: JLCPCB Part URL; ComponentLink2URL: https://jlcpcb.com/partdetail/C285968; ComponentLink3Description: LCSC Part URL; ComponentLink3URL: https://lcsc.com/product-detail/Inductors-SMD_Chilisin-Elec-Chilisin-Elec-CPY160808T-100M-NP_C285968.html
footprint IND-0603 (0603 (1608M) Inductor)
pins: 1, 2

## CS0603-1N8J-S
designator L?  Inductance: 1.8nH
Inductor, 1.8nH, ±5%, 45mΩ, 700mA, SMD 0603; Manufacturer: Chilisin Elec; Manufacturer Part Number: CS0603-1N8J-S; Self-Resonant Frequency: 12.5GHz; Q Factor: 16@250MHz; Package Size: 0603; JLCPCB Basic Part: No; JLCPCB Part Number: C280264; Supplier 1: LCSC; Category: Inductors; Supplier Part Number 1: C280264; Tolerance: ±5%; Rated Current: 700mA; DC Resistance: 45mΩ; RoHS: Yes; ComponentLink1Description: Datasheet; ComponentLink1URL: https://wmsc.lcsc.com/wmsc/upload/file/pdf/v2/lcsc/2304140030_Chilisin-Elec-CS0603-1N8J-S_C280264.pdf; ComponentLink2Description: JLCPCB Part URL; ComponentLink2URL: https://jlcpcb.com/partdetail/C280264; ComponentLink3Description: LCSC Part URL; ComponentLink3URL: https://lcsc.com/product-detail/Inductors-SMD_Chilisin-Elec-Chilisin-Elec-CS0603-1N8J-S_C280264.html
footprint IND-0603 (0603 (1608M) Inductor)
pins: 1, 2

## CS0603-2N2J-S
designator L?  Inductance: 2.2nH
Inductor, 2.2nH, ±5%, 250mΩ, 700mA, SMD 0603; Manufacturer: Chilisin Elec; Manufacturer Part Number: CS0603-2N2J-S; Self-Resonant Frequency: 12.5GHz; Q Factor: 13@250MHz; Package Size: 0603; JLCPCB Basic Part: No; JLCPCB Part Number: C280268; Supplier 1: LCSC; Category: Inductors; Supplier Part Number 1: C280268; Tolerance: ±5%; Rated Current: 700mA; DC Resistance: 250mΩ; RoHS: Yes; ComponentLink1Description: Datasheet; ComponentLink1URL: https://wmsc.lcsc.com/wmsc/upload/file/pdf/v2/lcsc/2304140030_Chilisin-Elec-CS0603-2N2J-S_C280268.pdf; ComponentLink2Description: JLCPCB Part URL; ComponentLink2URL: https://jlcpcb.com/partdetail/C280268; ComponentLink3Description: LCSC Part URL; ComponentLink3URL: https://lcsc.com/product-detail/Inductors-SMD_Chilisin-Elec-Chilisin-Elec-CS0603-2N2J-S_C280268.html
footprint IND-0603 (0603 (1608M) Inductor)
pins: 1, 2

## CS0603-3N3J-S
designator L?  Inductance: 3.3nH
Inductor, 3.3nH, ±5%, 45mΩ, 700mA, SMD 0603; Manufacturer: Chilisin Elec; Manufacturer Part Number: CS0603-3N3J-S; Self-Resonant Frequency: 5.9GHz; Q Factor: 35@250MHz; Package Size: 0603; JLCPCB Basic Part: No; JLCPCB Part Number: C280271; Supplier 1: LCSC; Category: Inductors; Supplier Part Number 1: C280271; Tolerance: ±5%; Rated Current: 700mA; DC Resistance: 45mΩ; RoHS: Yes; ComponentLink1Description: Datasheet; ComponentLink1URL: https://wmsc.lcsc.com/wmsc/upload/file/pdf/v2/lcsc/2304140030_Chilisin-Elec-CS0603-3N3J-S_C280271.pdf; ComponentLink2Description: JLCPCB Part URL; ComponentLink2URL: https://jlcpcb.com/partdetail/C280271; ComponentLink3Description: LCSC Part URL; ComponentLink3URL: https://lcsc.com/product-detail/Inductors-SMD_Chilisin-Elec-Chilisin-Elec-CS0603-3N3J-S_C280271.html
footprint IND-0603 (0603 (1608M) Inductor)
pins: 1, 2

## CS0603-3N9J-S
designator L?  Inductance: 3.9nH
Inductor, 3.9nH, ±5%, 80mΩ, 700mA, SMD 0603; Manufacturer: Chilisin Elec; Manufacturer Part Number: CS0603-3N9J-S; Self-Resonant Frequency: 6.9GHz; Q Factor: 22@250MHz; Package Size: 0603; JLCPCB Basic Part: No; JLCPCB Part Number: C280272; Supplier 1: LCSC; Category: Inductors; Supplier Part Number 1: C280272; Tolerance: ±5%; Rated Current: 700mA; DC Resistance: 80mΩ; RoHS: Yes; ComponentLink1Description: Datasheet; ComponentLink1URL: https://wmsc.lcsc.com/wmsc/upload/file/pdf/v2/lcsc/2304140030_Chilisin-Elec-CS0603-3N9J-S_C280272.pdf; ComponentLink2Description: JLCPCB Part URL; ComponentLink2URL: https://jlcpcb.com/partdetail/C280272; ComponentLink3Description: LCSC Part URL; ComponentLink3URL: https://lcsc.com/product-detail/Inductors-SMD_Chilisin-Elec-Chilisin-Elec-CS0603-3N9J-S_C280272.html
footprint IND-0603 (0603 (1608M) Inductor)
pins: 1, 2

## CS0603-4N7J-S
designator L?  Inductance: 4.7nH
Inductor, 4.7nH, ±5%, 116mΩ, 700mA, SMD 0603; Manufacturer: Chilisin Elec; Manufacturer Part Number: CS0603-4N7J-S; Self-Resonant Frequency: 5.8GHz; Q Factor: 20@250MHz; Package Size: 0603; JLCPCB Basic Part: No; JLCPCB Part Number: C280274; Supplier 1: LCSC; Category: Inductors; Supplier Part Number 1: C280274; Tolerance: ±5%; Rated Current: 700mA; DC Resistance: 116mΩ; RoHS: Yes; ComponentLink1Description: Datasheet; ComponentLink1URL: https://wmsc.lcsc.com/wmsc/upload/file/pdf/v2/lcsc/2304140030_Chilisin-Elec-CS0603-4N7J-S_C280274.pdf; ComponentLink2Description: JLCPCB Part URL; ComponentLink2URL: https://jlcpcb.com/partdetail/C280274; ComponentLink3Description: LCSC Part URL; ComponentLink3URL: https://lcsc.com/product-detail/Inductors-SMD_Chilisin-Elec-Chilisin-Elec-CS0603-4N7J-S_C280274.html
footprint IND-0603 (0603 (1608M) Inductor)
pins: 1, 2

## CS0603-5N1J-S
designator L?  Inductance: 5.1nH
Inductor, 5.1nH, ±5%, 140mΩ, 700mA, SMD 0603; Manufacturer: Chilisin Elec; Manufacturer Part Number: CS0603-5N1J-S; Self-Resonant Frequency: 5.7GHz; Q Factor: 20@250MHz; Package Size: 0603; JLCPCB Basic Part: No; JLCPCB Part Number: C285951; Supplier 1: LCSC; Category: Inductors; Supplier Part Number 1: C285951; Tolerance: ±5%; Rated Current: 700mA; DC Resistance: 140mΩ; RoHS: Yes; ComponentLink1Description: Datasheet; ComponentLink1URL: https://wmsc.lcsc.com/wmsc/upload/file/pdf/v2/lcsc/2304140030_Chilisin-Elec-CS0603-5N1J-S_C285951.pdf; ComponentLink2Description: JLCPCB Part URL; ComponentLink2URL: https://jlcpcb.com/partdetail/C285951; ComponentLink3Description: LCSC Part URL; ComponentLink3URL: https://lcsc.com/product-detail/Inductors-SMD_Chilisin-Elec-Chilisin-Elec-CS0603-5N1J-S_C285951.html
footprint IND-0603 (0603 (1608M) Inductor)
pins: 1, 2

## CS0603-5N6G-S
designator L?  Inductance: 5.6nH
Inductor, 5.6nH, ±2%, 170mΩ, 700mA, SMD 0603; Manufacturer: Chilisin Elec; Manufacturer Part Number: CS0603-5N6G-S; Self-Resonant Frequency: 5.8GHz; Q Factor: 20@250MHz; Package Size: 0603; JLCPCB Basic Part: No; JLCPCB Part Number: C142170; Supplier 1: LCSC; Category: Inductors; Supplier Part Number 1: C142170; Tolerance: ±2%; Rated Current: 700mA; DC Resistance: 170mΩ; RoHS: Yes; ComponentLink1Description: Datasheet; ComponentLink1URL: https://wmsc.lcsc.com/wmsc/upload/file/pdf/v2/lcsc/2304140030_Chilisin-Elec-CS0603-5N6G-S_C142170.pdf; ComponentLink2Description: JLCPCB Part URL; ComponentLink2URL: https://jlcpcb.com/partdetail/C142170; ComponentLink3Description: LCSC Part URL; ComponentLink3URL: https://lcsc.com/product-detail/Inductors-SMD_Chilisin-Elec-Chilisin-Elec-CS0603-5N6G-S_C142170.html
footprint IND-0603 (0603 (1608M) Inductor)
pins: 1, 2

## CS0603-8N2J-S
designator L?  Inductance: 8.2nH
Inductor, 8.2nH, ±5%, 109mΩ, 700mA, SMD 0603; Manufacturer: Chilisin Elec; Manufacturer Part Number: CS0603-8N2J-S; Self-Resonant Frequency: 4.7GHz; Q Factor: 28@250MHz; Package Size: 0603; JLCPCB Basic Part: No; JLCPCB Part Number: C280279; Supplier 1: LCSC; Category: Inductors; Supplier Part Number 1: C280279; Tolerance: ±5%; Rated Current: 700mA; DC Resistance: 109mΩ; RoHS: Yes; ComponentLink1Description: Datasheet; ComponentLink1URL: https://wmsc.lcsc.com/wmsc/upload/file/pdf/v2/lcsc/2304140030_Chilisin-Elec-CS0603-8N2J-S_C280279.pdf; ComponentLink2Description: JLCPCB Part URL; ComponentLink2URL: https://jlcpcb.com/partdetail/C280279; ComponentLink3Description: LCSC Part URL; ComponentLink3URL: https://lcsc.com/product-detail/Inductors-SMD_Chilisin-Elec-Chilisin-Elec-CS0603-8N2J-S_C280279.html
footprint IND-0603 (0603 (1608M) Inductor)
pins: 1, 2

## CS0603-10NJ-S
designator L?  Inductance: 10nH
Inductor, 10nH, ±5%, 130mΩ, 700mA, SMD 0603; Manufacturer: Chilisin Elec; Manufacturer Part Number: CS0603-10NJ-S; Self-Resonant Frequency: 4.8GHz; Q Factor: 31@250MHz; Package Size: 0603; JLCPCB Basic Part: No; JLCPCB Part Number: C280260; Supplier 1: LCSC; Category: Inductors; Supplier Part Number 1: C280260; Tolerance: ±5%; Rated Current: 700mA; DC Resistance: 130mΩ; RoHS: Yes; ComponentLink1Description: Datasheet; ComponentLink1URL: https://wmsc.lcsc.com/wmsc/upload/file/pdf/v2/lcsc/2304140030_Chilisin-Elec-CS0603-10NJ-S_C280260.pdf; ComponentLink2Description: JLCPCB Part URL; ComponentLink2URL: https://jlcpcb.com/partdetail/C280260; ComponentLink3Description: LCSC Part URL; ComponentLink3URL: https://lcsc.com/product-detail/Inductors-SMD_Chilisin-Elec-Chilisin-Elec-CS0603-10NJ-S_C280260.html
footprint IND-0603 (0603 (1608M) Inductor)
pins: 1, 2

## CS0603-12NG-S
designator L?  Inductance: 12nH
Inductor, 12nH, ±2%, 130mΩ, 700mA, SMD 0603; Manufacturer: Chilisin Elec; Manufacturer Part Number: CS0603-12NG-S; Self-Resonant Frequency: 4GHz; Q Factor: 35@250MHz; Package Size: 0603; JLCPCB Basic Part: No; JLCPCB Part Number: C142172; Supplier 1: LCSC; Category: Inductors; Supplier Part Number 1: C142172; Tolerance: ±2%; Rated Current: 700mA; DC Resistance: 130mΩ; RoHS: Yes; ComponentLink1Description: Datasheet; ComponentLink1URL: https://wmsc.lcsc.com/wmsc/upload/file/pdf/v2/lcsc/2304140030_Chilisin-Elec-CS0603-12NG-S_C142172.pdf; ComponentLink2Description: JLCPCB Part URL; ComponentLink2URL: https://jlcpcb.com/partdetail/C142172; ComponentLink3Description: LCSC Part URL; ComponentLink3URL: https://lcsc.com/product-detail/Inductors-SMD_Chilisin-Elec-Chilisin-Elec-CS0603-12NG-S_C142172.html
footprint IND-0603 (0603 (1608M) Inductor)
pins: 1, 2

## CS0603-12NJ-S
designator L?  Inductance: 12nH
Inductor, 12nH, ±5%, 130mΩ, 700mA, SMD 0603; Manufacturer: Chilisin Elec; Manufacturer Part Number: CS0603-12NJ-S; Self-Resonant Frequency: 4GHz; Q Factor: 35@250MHz; Package Size: 0603; JLCPCB Basic Part: No; JLCPCB Part Number: C280261; Supplier 1: LCSC; Category: Inductors; Supplier Part Number 1: C280261; Tolerance: ±5%; Rated Current: 700mA; DC Resistance: 130mΩ; RoHS: Yes; ComponentLink1Description: Datasheet; ComponentLink1URL: https://wmsc.lcsc.com/wmsc/upload/file/pdf/v2/lcsc/2304140030_Chilisin-Elec-CS0603-12NJ-S_C280261.pdf; ComponentLink2Description: JLCPCB Part URL; ComponentLink2URL: https://jlcpcb.com/partdetail/C280261; ComponentLink3Description: LCSC Part URL; ComponentLink3URL: https://lcsc.com/product-detail/Inductors-SMD_Chilisin-Elec-Chilisin-Elec-CS0603-12NJ-S_C280261.html
footprint IND-0603 (0603 (1608M) Inductor)
pins: 1, 2

## CS0603-15NJ-S
designator L?  Inductance: 15nH
Inductor, 15nH, ±5%, 170mΩ, 700mA, SMD 0603; Manufacturer: Chilisin Elec; Manufacturer Part Number: CS0603-15NJ-S; Self-Resonant Frequency: 4GHz; Q Factor: 35@250MHz; Package Size: 0603; JLCPCB Basic Part: No; JLCPCB Part Number: C280262; Supplier 1: LCSC; Category: Inductors; Supplier Part Number 1: C280262; Tolerance: ±5%; Rated Current: 700mA; DC Resistance: 170mΩ; RoHS: Yes; ComponentLink1Description: Datasheet; ComponentLink1URL: https://wmsc.lcsc.com/wmsc/upload/file/pdf/v2/lcsc/2304140030_Chilisin-Elec-CS0603-15NJ-S_C280262.pdf; ComponentLink2Description: JLCPCB Part URL; ComponentLink2URL: https://jlcpcb.com/partdetail/C280262; ComponentLink3Description: LCSC Part URL; ComponentLink3URL: https://lcsc.com/product-detail/Inductors-SMD_Chilisin-Elec-Chilisin-Elec-CS0603-15NJ-S_C280262.html
footprint IND-0603 (0603 (1608M) Inductor)
pins: 1, 2

## CS0603-18NJ-S
designator L?  Inductance: 18nH
Inductor, 18nH, ±5%, 170mΩ, 700mA, SMD 0603; Manufacturer: Chilisin Elec; Manufacturer Part Number: CS0603-18NJ-S; Self-Resonant Frequency: 3.1GHz; Q Factor: 35@250MHz; Package Size: 0603; JLCPCB Basic Part: No; JLCPCB Part Number: C280263; Supplier 1: LCSC; Category: Inductors; Supplier Part Number 1: C280263; Tolerance: ±5%; Rated Current: 700mA; DC Resistance: 170mΩ; RoHS: Yes; ComponentLink1Description: Datasheet; ComponentLink1URL: https://wmsc.lcsc.com/wmsc/upload/file/pdf/v2/lcsc/2304140030_Chilisin-Elec-CS0603-18NJ-S_C280263.pdf; ComponentLink2Description: JLCPCB Part URL; ComponentLink2URL: https://jlcpcb.com/partdetail/C280263; ComponentLink3Description: LCSC Part URL; ComponentLink3URL: https://lcsc.com/product-detail/Inductors-SMD_Chilisin-Elec-Chilisin-Elec-CS0603-18NJ-S_C280263.html
footprint IND-0603 (0603 (1608M) Inductor)
pins: 1, 2

## CS0603-22NJ-S
designator L?  Inductance: 22nH
Inductor, 22nH, ±5%, 190mΩ, 700mA, SMD 0603; Manufacturer: Chilisin Elec; Manufacturer Part Number: CS0603-22NJ-S; Self-Resonant Frequency: 3GHz; Q Factor: 38@250MHz; Package Size: 0603; JLCPCB Basic Part: No; JLCPCB Part Number: C280265; Supplier 1: LCSC; Category: Inductors; Supplier Part Number 1: C280265; Tolerance: ±5%; Rated Current: 700mA; DC Resistance: 190mΩ; RoHS: Yes; ComponentLink1Description: Datasheet; ComponentLink1URL: https://wmsc.lcsc.com/wmsc/upload/file/pdf/v2/lcsc/2304140030_Chilisin-Elec-CS0603-22NJ-S_C280265.pdf; ComponentLink2Description: JLCPCB Part URL; ComponentLink2URL: https://jlcpcb.com/partdetail/C280265; ComponentLink3Description: LCSC Part URL; ComponentLink3URL: https://lcsc.com/product-detail/Inductors-SMD_Chilisin-Elec-Chilisin-Elec-CS0603-22NJ-S_C280265.html
footprint IND-0603 (0603 (1608M) Inductor)
pins: 1, 2

## CS0603-24NJ-S
designator L?  Inductance: 24nH
Inductor, 24nH, ±5%, 135mΩ, 700mA, SMD 0603; Manufacturer: Chilisin Elec; Manufacturer Part Number: CS0603-24NJ-S; Self-Resonant Frequency: 2.65GHz; Q Factor: 37@250MHz; Package Size: 0603; JLCPCB Basic Part: No; JLCPCB Part Number: C280266; Supplier 1: LCSC; Category: Inductors; Supplier Part Number 1: C280266; Tolerance: ±5%; Rated Current: 700mA; DC Resistance: 135mΩ; RoHS: Yes; ComponentLink1Description: Datasheet; ComponentLink1URL: https://wmsc.lcsc.com/wmsc/upload/file/pdf/v2/lcsc/2304140030_Chilisin-Elec-CS0603-24NJ-S_C280266.pdf; ComponentLink2Description: JLCPCB Part URL; ComponentLink2URL: https://jlcpcb.com/partdetail/C280266; ComponentLink3Description: LCSC Part URL; ComponentLink3URL: https://lcsc.com/product-detail/Inductors-SMD_Chilisin-Elec-Chilisin-Elec-CS0603-24NJ-S_C280266.html
footprint IND-0603 (0603 (1608M) Inductor)
pins: 1, 2

## CS0603-27NJ-N
designator L?  Inductance: 27nH
Inductor, 27nH, ±5%, SMD 0603; Manufacturer: Chilisin Elec; Manufacturer Part Number: CS0603-27NJ-N; Package Size: 0603; JLCPCB Basic Part: No; JLCPCB Part Number: C285952; Supplier 1: LCSC; Category: Inductors; Supplier Part Number 1: C285952; Tolerance: ±5%; RoHS: Yes; ComponentLink1Description: Datasheet; ComponentLink1URL: https://wmsc.lcsc.com/wmsc/upload/file/pdf/v2/lcsc/2304140030_Chilisin-Elec-CS0603-27NJ-N_C285952.pdf; ComponentLink2Description: JLCPCB Part URL; ComponentLink2URL: https://jlcpcb.com/partdetail/C285952; ComponentLink3Description: LCSC Part URL; ComponentLink3URL: https://lcsc.com/product-detail/Inductors-SMD_Chilisin-Elec-Chilisin-Elec-CS0603-27NJ-N_C285952.html
footprint IND-0603 (0603 (1608M) Inductor)
pins: 1, 2

## CS0603-27NJ-S
designator L?  Inductance: 27nH
Inductor, 27nH, ±5%, 220mΩ, 600mA, SMD 0603; Manufacturer: Chilisin Elec; Manufacturer Part Number: CS0603-27NJ-S; Self-Resonant Frequency: 2.8GHz; Q Factor: 40@250MHz; Package Size: 0603; JLCPCB Basic Part: No; JLCPCB Part Number: C280267; Supplier 1: LCSC; Category: Inductors; Supplier Part Number 1: C280267; Tolerance: ±5%; Rated Current: 600mA; DC Resistance: 220mΩ; RoHS: Yes; ComponentLink1Description: Datasheet; ComponentLink1URL: https://wmsc.lcsc.com/wmsc/upload/file/pdf/v2/lcsc/2203301730_Chilisin-Elec-CS0603-27NJ-S_C280267.pdf; ComponentLink2Description: JLCPCB Part URL; ComponentLink2URL: https://jlcpcb.com/partdetail/C280267; ComponentLink3Description: LCSC Part URL; ComponentLink3URL: https://lcsc.com/product-detail/Inductors-SMD_Chilisin-Elec-Chilisin-Elec-CS0603-27NJ-S_C280267.html
footprint IND-0603 (0603 (1608M) Inductor)
pins: 1, 2

## CS0603-30NJ-S
designator L?  Inductance: 30nH
Inductor, 30nH, ±5%, 144mΩ, 600mA, SMD 0603; Manufacturer: Chilisin Elec; Manufacturer Part Number: CS0603-30NJ-S; Self-Resonant Frequency: 2.25GHz; Q Factor: 37@250MHz; Package Size: 0603; JLCPCB Basic Part: No; JLCPCB Part Number: C280269; Supplier 1: LCSC; Category: Inductors; Supplier Part Number 1: C280269; Tolerance: ±5%; Rated Current: 600mA; DC Resistance: 144mΩ; RoHS: Yes; ComponentLink1Description: Datasheet; ComponentLink1URL: https://wmsc.lcsc.com/wmsc/upload/file/pdf/v2/lcsc/1810262121_Chilisin-Elec-CS0603-30NJ-S_C280269.pdf; ComponentLink2Description: JLCPCB Part URL; ComponentLink2URL: https://jlcpcb.com/partdetail/C280269; ComponentLink3Description: LCSC Part URL; ComponentLink3URL: https://lcsc.com/product-detail/Inductors-SMD_Chilisin-Elec-Chilisin-Elec-CS0603-30NJ-S_C280269.html
footprint IND-0603 (0603 (1608M) Inductor)
pins: 1, 2